# Altium footprint library Intelliclone.PcbLib: 372 footprints (part 22 of 24)
Each footprint in its own frame and in the unit in brackets; x right, y up, seen from the top. Pads: shape width x height; smd on the part's side, far side on the other; paste and mask are expansions set on the pad; w line width, h text height; cw(c..) or ccw(c..) is an arc to the next point about the centre after c.
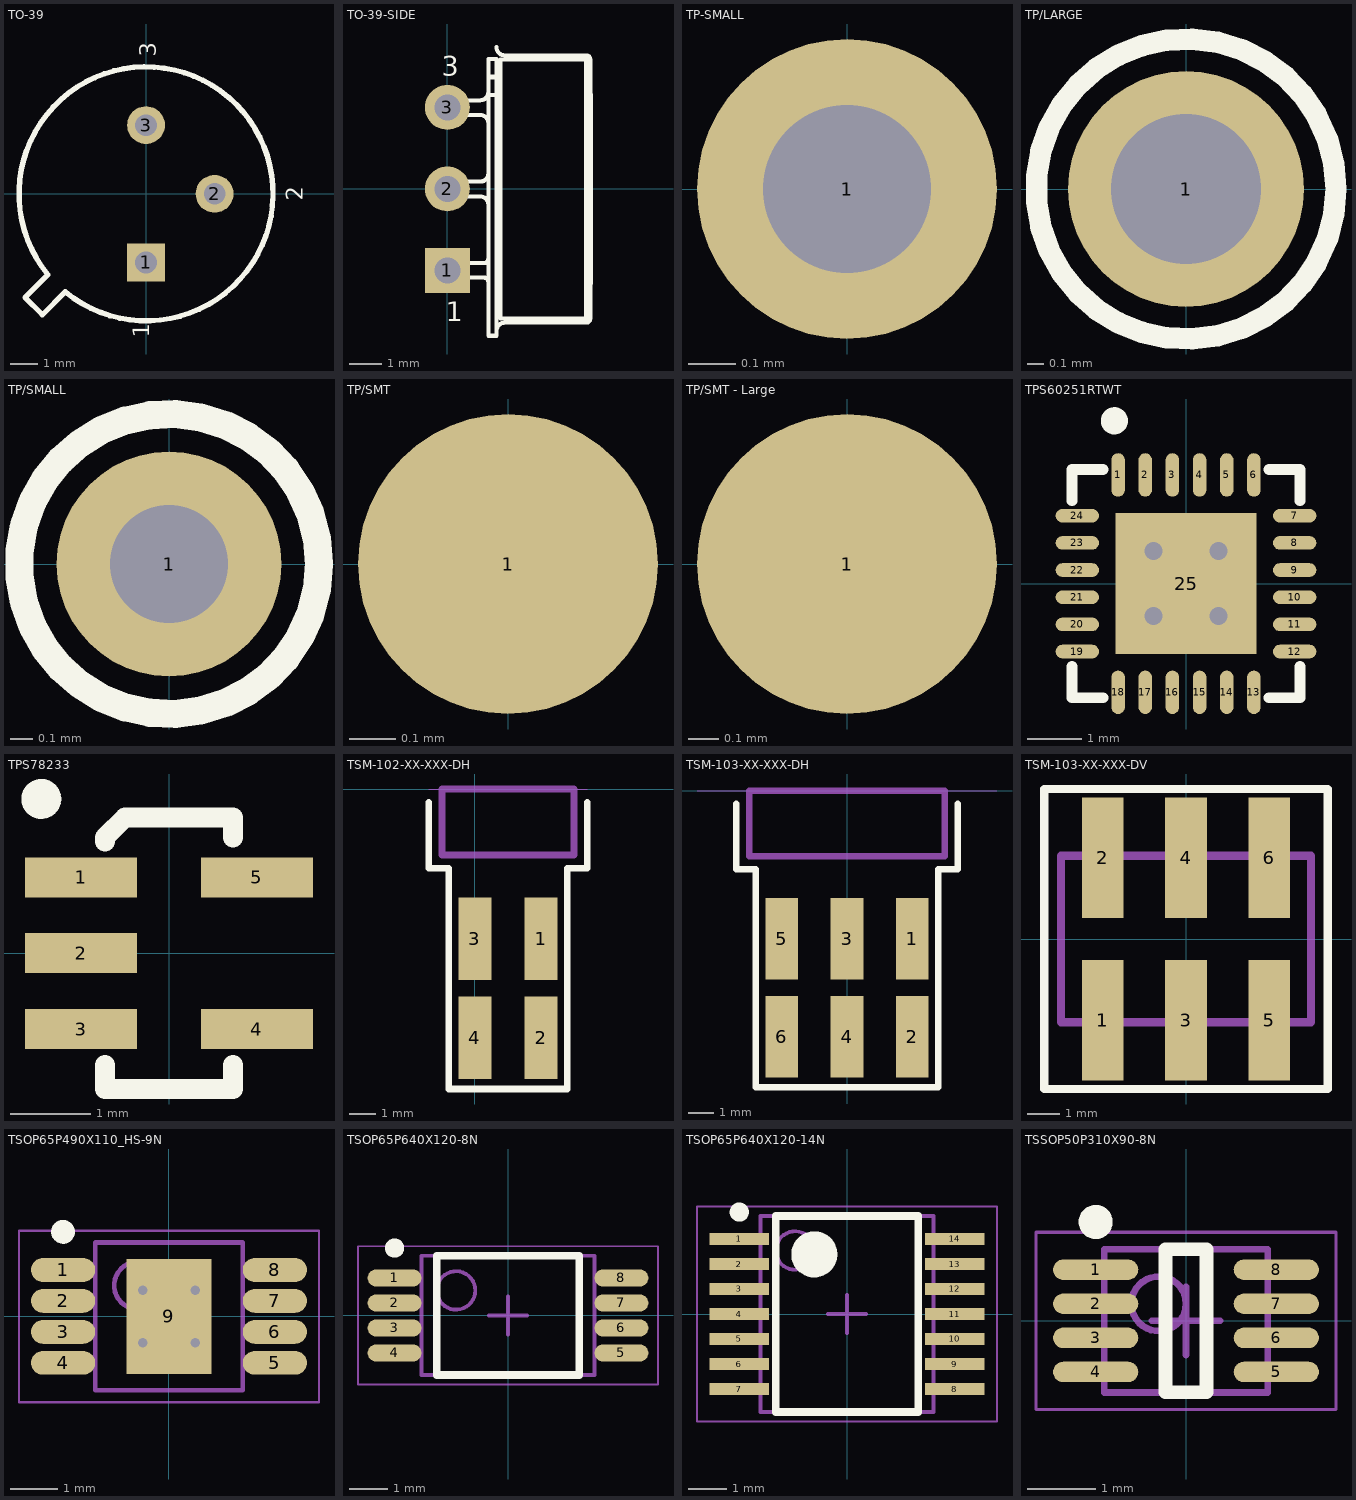
[diagram p21: the footprints below, top view; thin cyan lines are the x and y axes]

## TO-39 [mm] "Can; 3 Leads; Pin Circle Dia. 5.08 mm; Lead Dia. 0.48 mm (max)"
height 4.55
pads (3):
  rect 1.4x1.4 hole 0.8: 1(0,-2.54)
  round 1.4 hole 0.8: 2(2.54,0) 3(0,2.54)
Top Overlay:
  lines w0.2: -4.475,-3.838 -3.838,-4.475 -2.99,-3.626 ccw(c0,0) -3.626,-2.99 -4.475,-3.838
  text "1" at 0.127,-5.334 h0.61
  text "2" at 5.791,-0.254 h0.61
  text "3" at 0.381,5.08 h0.61

## TO-39-SIDE [mm] "Can; 3 Leads; Pin Circle Dia. 5.08 mm; Lead Dia. 0.48 mm (max)"
height 4.55
pads (3):
  rect 1.4x1.4 hole 0.8: 1(0,-2.54)
  round 1.4 hole 0.8: 2(0,0) 3(0,2.54)
Top Overlay:
  lines w0.127: 0.004,0.227 1.02,0.227 ccw(c1.02,0.481) 1.274,0.481 ; 0.009,-0.23 0.004,-0.23 ; 0.009,0.227 0.004,0.227 0.004,-0.23 ; 1.274,-2.892 ccw(c1.147,-2.892) 1.147,-2.765 0.004,-2.765 0.004,-2.308 1.147,-2.308 ccw(c1.147,-2.181) 1.274,-2.181 ; 1.274,-0.484 ccw(c1.02,-0.484) 1.02,-0.23 0.004,-0.23 ; 1.274,2.05 ccw(c1.02,2.05) 1.02,2.304 0.004,2.304 0.004,2.761 1.02,2.761 ccw(c1.02,3.015) 1.274,3.015 ; 1.274,3.506 1.528,3.506 ; 1.528,-4.421 cw(c1.782,-4.421) 1.782,-4.167 4.322,-4.167 ccw(c4.322,-4.04) 4.449,-4.04 4.449,4.037 ccw(c4.322,4.037) 4.322,4.164 1.782,4.164 cw(c1.782,4.418) 1.528,4.418 ; 4.322,-2.948 4.449,-2.948 4.474,-2.948 4.474,2.945 4.449,2.945 4.322,2.945 ; 1.274,2.931 1.528,2.931 ; 1.274,2.931 1.274,3.47 ; 1.274,2.931 1.274,-4.574 1.528,-4.574 1.528,2.931 ; 1.274,3.47 1.528,3.47 ; 1.274,3.47 1.274,4.044 1.528,4.044 1.528,3.47 ; 1.528,2.931 1.528,3.47 ; 1.655,-4.04 4.322,-4.04 4.322,4.037 1.655,4.037 1.655,-4.04
  text "3" at -0.178,3.531 h0.61
  text "1" at -0.051,-4.115 h0.61
Mechanical 14:
  circle w0.127: c0.004,2.533 r0.229
  circle w0.127: c0.004,-2.537 r0.229
  circle w0.127: c0.004,-0.002 r0.229

## TP-SMALL [mil] "Test Point, Small"
pads (1):
  round 25 hole 14: 1(0,0)

## TP/LARGE [mil]
pads (1):
  round 55 hole 35: 1(0,0)
Top Overlay:
  circle w5: c0,0 r35

## TP/SMALL [mil]
pads (1):
  round 40 hole 21: 1(0,0)
Top Overlay:
  circle w5: c0,0 r26.69

## TP/SMT [mm]
pads (1):
  round 0.65 smd paste-1: 1(0,0)

## TP/SMT - Large [mm]
pads (1):
  round 1 smd paste-1: 1(0,0)

## TPS60251RTWT [mm]
height 0.8
pads (25):
  oval 0.25x0.8 smd: 1(-1.25,2) 2(-0.75,2) 3(-0.25,2) 4(0.25,2) 5(0.75,2) 6(1.25,2) 13(1.25,-2) 14(0.75,-2) 15(0.25,-2) 16(-0.25,-2) 17(-0.75,-2) 18(-1.25,-2)
  oval 0.8x0.25 smd: 7(2,1.25) 8(2,0.75) 9(2,0.25) 10(2,-0.25) 11(2,-0.75) 12(2,-1.25) 19(-2,-1.25) 20(-2,-0.75) 21(-2,-0.25) 22(-2,0.25) 23(-2,0.75) 24(-2,1.25)
  rect 2.6x2.6 smd: 25(0,0)
via -0.6,0.6 diameter 0.686 hole 0.33
via 0.6,0.6 diameter 0.686 hole 0.33
via -0.6,-0.6 diameter 0.686 hole 0.33
via 0.6,-0.6 diameter 0.686 hole 0.33
Top Overlay:
  circle w0.25: c-1.319,2.997 r0.125
  lines w0.2: -2.1,-1.525 -2.1,-2.1 -1.525,-2.1 ; -2.1,1.525 -2.1,2.1 -1.525,2.1 ; 1.525,-2.1 2.1,-2.1 2.1,-1.525 ; 1.525,2.1 2.1,2.1 2.1,1.525
3D body: height 0.8, standoff 0.01, extent -2.075,-2.075 2.075,2.075

## TPS78233 [mm]
pads (5):
  rect 1.4x0.5 smd: 1(-1.1,0.95) 2(-1.1,0) 3(-1.1,-0.95) 4(1.1,-0.95) 5(1.1,0.95)
Top Overlay:
  circle w0.25: c-1.598,1.93 r0.125
  lines w0.249: -0.8,-1.4 -0.8,-1.699 0.8,-1.699 0.8,-1.4 ; -0.8,1.4 -0.8,1.45 -0.551,1.699 0.8,1.699 0.8,1.45
3D body: height 1.45, standoff 0.1, extent -0.813,-1.651 0.813,1.676

## TSM-102-XX-XXX-DH [mil]
pads (4):
  rect 50x125 smd mask+2: 1(100,-227) 2(100,-377) 3(0,-227) 4(0,-377)
Top Overlay:
  lines w10: -70,-20 -70,-120 -40,-120 -40,-454.5 140,-454.5 140,-120 170,-120 170,-20
Mechanical 1:
  lines w10: -50,-100 -50,0 150,0 150,-100 -50,-100
  text "J1" at 40,-60 h30
Mechanical 21:
  lines w1: -70,0 170,0
3D body "TSM-102-01-T-DH.stp": height 238, standoff -2, extent -50,-420 150,220

## TSM-103-XX-XXX-DH [mil]
pads (6):
  rect 50x125 smd mask+2: 1(100,-227) 2(100,-377) 3(0,-227) 4(0,-377) 5(-100,-227) 6(-100,-377)
Top Overlay:
  lines w10: -170,-20 -170,-120 -140,-120 -140,-454.5 140,-454.5 140,-120 170,-120 170,-20
Mechanical 1:
  lines w10: -150,-100 150,-100 150,0 -150,0 -150,-100
  text "J1" at -17.57,-58 h30
Mechanical 21:
  lines w1: -230,0 230,0

## TSM-103-XX-XXX-DV [mil]
pads (6):
  rect 50x145 smd mask+2: 1(-100,-97.5) 2(-100,97.5) 3(0,-97.5) 4(0,97.5) 5(100,-97.5) 6(100,97.5)
Top Overlay:
  lines w10: -170,-180 -170,180 170,180 170,-180 -170,-180
Mechanical 1:
  lines w10: -150,-100 -150,100 150,100 150,-100 -150,-100
  text "J1" at -19.57,-20 h30
3D body "TSM-103-01-F-DV.stp": height 380, standoff 0, extent -149.99,-151.49 150.01,151.51

## TSOP65P490X110_HS-9N [mm] "TSOP, 8-Leads, Body 3.00x3.00mm, Pitch 0.65mm, Thermal Pad 2.41x1.78mm, IPC Medium Density"
height 1.1
pads (9):
  oval 1.35x0.5 smd: 1(-2.225,0.975) 2(-2.225,0.325) 3(-2.225,-0.325) 4(-2.225,-0.975) 5(2.225,-0.975) 6(2.225,-0.325) 7(2.225,0.325) 8(2.225,0.975)
  rect 1.78x2.41 smd: 9(0,0)
via -0.55,0.55 diameter 0.5 hole 0.2
via 0.55,0.55 diameter 0.5 hole 0.2
via -0.55,-0.55 diameter 0.5 hole 0.2
via 0.55,-0.55 diameter 0.5 hole 0.2
Top Overlay:
  circle w0.25: c-2.225,1.775 r0.125
Mechanical 13:
  circle w0.1: c-0.65,0.65 r0.5
  lines w0.1: -1.55,-1.55 -1.55,1.55 1.55,1.55 1.55,-1.55 -1.55,-1.55
Mechanical 15:
  lines w0.05: -3.15,-1.8 -3.15,1.8 3.15,1.8 3.15,-1.8 -3.15,-1.8
  lines w0.1: -0.5,0 0.5,0 ; 0,-0.5 0,0.5
3D body: height 1.1, standoff 0.13, extent -1.55,-1.55 1.55,1.55

## TSOP65P640X120-8N [mm] "TSOP, 8-Leads, Body 3.00x4.40mm, Pitch 0.65mm, IPC Medium Density"
height 1.2
pads (8):
  oval 1.4x0.45 smd: 1(-2.95,0.975) 2(-2.95,0.325) 3(-2.95,-0.325) 4(-2.95,-0.975) 5(2.95,-0.975) 6(2.95,-0.325) 7(2.95,0.325) 8(2.95,0.975)
Top Overlay:
  circle w0.25: c-2.95,1.75 r0.125
  lines w0.2: -1.85,-1.55 1.85,-1.55 1.85,1.55 -1.85,1.55 -1.85,-1.55
Mechanical 13:
  circle w0.1: c-1.35,0.65 r0.5
  lines w0.1: -2.25,-1.55 2.25,-1.55 2.25,1.55 -2.25,1.55 -2.25,-1.55
Mechanical 15:
  lines w0.05: -3.9,-1.8 3.9,-1.8 3.9,1.8 -3.9,1.8 -3.9,-1.8
  lines w0.1: -0.5,0 0.5,0 ; 0,-0.5 0,0.5
3D body "TSOP65P640X120-8N.step": height 1.2, standoff 0, extent -3.2,-1.55 3.2,1.55

## TSOP65P640X120-14N [mm] "TSOP, 14-Leads, Body 5.00x4.40mm, Pitch 0.65mm, IPC Medium Density"
height 1.2
pads (14):
  rect 1.55x0.3 smd: 1(-2.8,1.95) 2(-2.8,1.3) 3(-2.8,0.65) 4(-2.8,0) 5(-2.8,-0.65) 6(-2.8,-1.3) 7(-2.8,-1.95) 8(2.8,-1.95) 9(2.8,-1.3) 10(2.8,-0.65) 11(2.8,0) 12(2.8,0.65) 13(2.8,1.3) 14(2.8,1.95)
Top Overlay:
  circle w0.6: c-0.85,1.55 r0.3
  circle w0.25: c-2.8,2.65 r0.125
  lines w0.2: -1.85,-2.55 1.85,-2.55 1.85,2.55 -1.85,2.55 -1.85,-2.55
Mechanical 13:
  circle w0.1: c-1.35,1.65 r0.5
  lines w0.1: -2.25,-2.55 2.25,-2.55 2.25,2.55 -2.25,2.55 -2.25,-2.55
Mechanical 15:
  lines w0.05: -3.9,-2.8 3.9,-2.8 3.9,2.8 -3.9,2.8 -3.9,-2.8
  lines w0.1: -0.5,0 0.5,0 ; 0,-0.5 0,0.5
3D body "PW0014A.stp": height 1.13, standoff 0, extent -3.2,-2.5 3.2,2.5

## TSSOP50P310X90-8N [mm] "TSSOP, 8-Leads, Body 2.00x2.30mm, Pitch 0.50mm, IPC Medium Density"
height 0.9
pads (8):
  oval 1.25x0.3 smd: 1(-1.325,0.75) 2(-1.325,0.25) 3(-1.325,-0.25) 4(-1.325,-0.75) 5(1.325,-0.75) 6(1.325,-0.25) 7(1.325,0.25) 8(1.325,0.75)
Top Overlay:
  circle w0.25: c-1.325,1.45 r0.125
  lines w0.2: -0.3,-1.05 -0.3,1.05 0.3,1.05 0.3,-1.05 -0.3,-1.05
Mechanical 13:
  circle w0.1: c-0.4,0.25 r0.4
  lines w0.1: -1.2,-1.05 -1.2,1.05 1.2,1.05 1.2,-1.05 -1.2,-1.05
Mechanical 15:
  lines w0.05: -2.2,-1.3 -2.2,1.3 2.2,1.3 2.2,-1.3 -2.2,-1.3
  lines w0.1: -0.5,0 0.5,0 ; 0,-0.5 0,0.5
3D body: height 0.9, standoff 0.1, extent -1.2,-1.05 1.2,1.05